# Altium footprint library PcbLib_ICs.PcbLib: 317 footprints (part 13 of 24)
Each footprint in its own frame and in the unit in brackets; x right, y up, seen from the top. Pads: shape width x height; smd on the part's side, far side on the other; paste and mask are expansions set on the pad; w line width, h text height; cw(c..) or ccw(c..) is an arc to the next point about the centre after c.
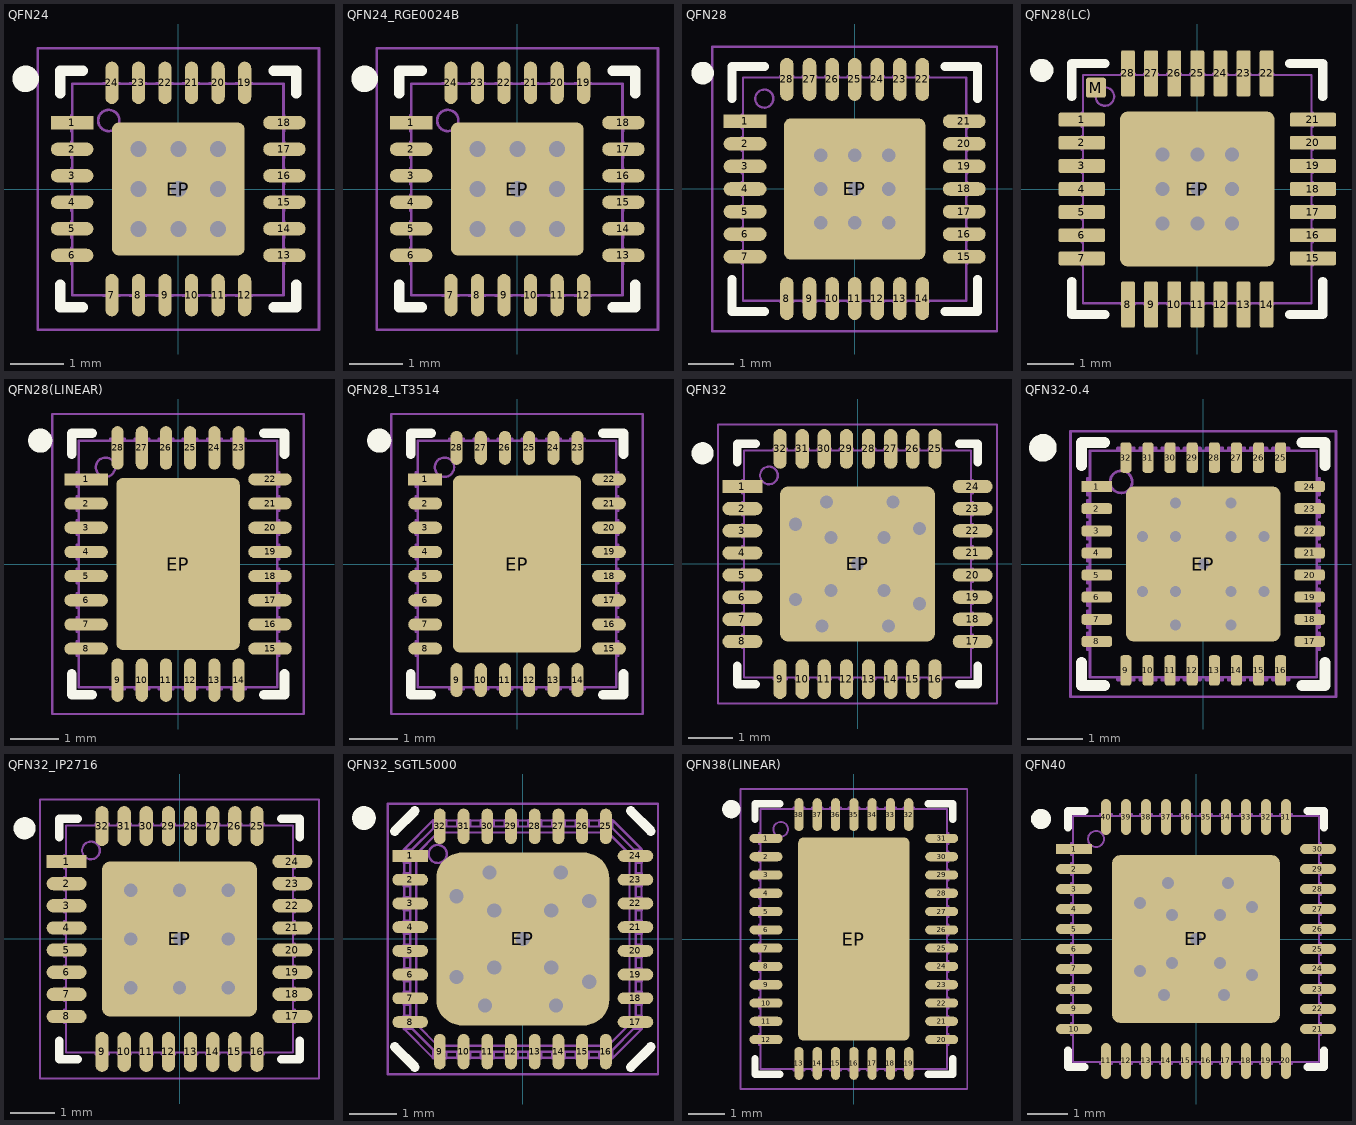
[diagram p12: the footprints below, top view; thin cyan lines are the x and y axes]

## QFN24 [mm] "QFN, 24-Leads, Body 4.00x4.00mm, Pitch 0.50mm, Thermal Pad 2.50x2.50mm, IPC Medium Density"
height 1
pads (25):
  rect 0.8x0.25 smd paste+0 mask+0.05: 1(-2,1.25)
  oval 0.8x0.25 smd paste+0 mask+0.05: 2(-2,0.75) 3(-2,0.25) 4(-2,-0.25) 5(-2,-0.75) 6(-2,-1.25) 13(2,-1.25) 14(2,-0.75) 15(2,-0.25) 16(2,0.25) 17(2,0.75) 18(2,1.25)
  oval 0.25x0.8 smd paste+0 mask+0.05: 7(-1.25,-2) 8(-0.75,-2) 9(-0.25,-2) 10(0.25,-2) 11(0.75,-2) 12(1.25,-2) 19(1.25,2) 20(0.75,2) 21(0.25,2) 22(-0.25,2) 23(-0.75,2) 24(-1.25,2)
  rrect10% 2.5x2.5 smd paste-10: EP(0,0)
via 0,-0.75 diameter 0.7 hole 0.3
via 0.75,0 diameter 0.7 hole 0.3
via 0,0.75 diameter 0.7 hole 0.3
via -0.75,0 diameter 0.7 hole 0.3
via -0.75,-0.75 diameter 0.7 hole 0.3
via 0.75,-0.75 diameter 0.7 hole 0.3
via 0.75,0.75 diameter 0.7 hole 0.3
via -0.75,0.75 diameter 0.7 hole 0.3
via 0,0 diameter 0.7 hole 0.3
Top Overlay:
  circle w0.25: c-2.875,2.075 r0.125
  lines w0.2: -2.225,-1.8 -2.225,-2.225 -1.8,-2.225 ; -2.225,1.8 -2.225,2.225 -1.8,2.225 ; 1.8,-2.225 2.225,-2.225 2.225,-1.8 ; 1.8,2.225 2.225,2.225 2.225,1.8
Top Paste:
  rectangle: -1.15,0.65 -0.65,1.15
  rectangle: -0.55,0.65 -0.05,1.15
  rectangle: 0.05,0.65 0.55,1.15
  rectangle: 0.65,0.65 1.15,1.15
  rectangle: 0.65,0.05 1.15,0.55
  rectangle: 0.05,0.05 0.55,0.55
  rectangle: -0.55,0.05 -0.05,0.55
  rectangle: -1.15,0.05 -0.65,0.55
  rectangle: 0.65,-0.55 1.15,-0.05
  rectangle: 0.05,-0.55 0.55,-0.05
  rectangle: -0.55,-0.55 -0.05,-0.05
  rectangle: -1.15,-0.55 -0.65,-0.05
  rectangle: 0.65,-1.15 1.15,-0.65
  rectangle: 0.05,-1.15 0.55,-0.65
  rectangle: -0.55,-1.15 -0.05,-0.65
  rectangle: -1.15,-1.15 -0.65,-0.65
Bottom Solder:
  region: -1.5,1.5 -0.25,1.5 0,1.25 0.25,1.5 1.5,1.499 1.5,0.25 1.25,0 1.5,-0.25 1.5,-1.5 0.25,-1.5 0,-1.25 -0.25,-1.5 -1.5,-1.5 -1.5,-0.25 -1.25,0 -1.5,0.25
Top Assy:
  circle w0.05: c-1.31,1.29 r0.2
  lines w0.05: -2,-1.415 -2.01,-1.415 -2.01,-1.105 -2,-1.105 ; -2,-0.915 -2.01,-0.915 -2.01,-0.605 -2,-0.605 ; -2,-0.415 -2.01,-0.415 -2.01,-0.105 -2,-0.105 ; -2,0.085 -2.01,0.085 -2.01,0.395 -2,0.395 ; -2,0.585 -2.01,0.585 -2.01,0.895 -2,0.895 ; -2,1.085 -2.01,1.085 -2.01,1.395 -2,1.395 ; -1.415,-2 -1.415,-2.01 -1.105,-2.01 -1.105,-2 ; -1.415,1.98 -1.415,1.99 -1.105,1.99 -1.105,1.98 ; -0.915,-2 -0.915,-2.01 -0.605,-2.01 -0.605,-2 ; -0.915,1.98 -0.915,1.99 -0.605,1.99 -0.605,1.98 ; -0.415,-2 -0.415,-2.01 -0.105,-2.01 -0.105,-2 ; -0.415,1.98 -0.415,1.99 -0.105,1.99 -0.105,1.98 ; 0.085,-2 0.085,-2.01 0.395,-2.01 0.395,-2 ; 0.085,1.98 0.085,1.99 0.395,1.99 0.395,1.98 ; 0.585,-2 0.585,-2.01 0.895,-2.01 0.895,-2 ; 0.585,1.98 0.585,1.99 0.895,1.99 0.895,1.98 ; 1.085,-2 1.085,-2.01 1.395,-2.01 1.395,-2 ; 1.085,1.98 1.085,1.99 1.395,1.99 1.395,1.98 ; 1.98,-1.415 1.99,-1.415 1.99,-1.105 1.98,-1.105 ; 1.98,-0.915 1.99,-0.915 1.99,-0.605 1.98,-0.605 ; 1.98,-0.415 1.99,-0.415 1.99,-0.105 1.98,-0.105 ; 1.98,0.085 1.99,0.085 1.99,0.395 1.98,0.395 ; 1.98,0.585 1.99,0.585 1.99,0.895 1.98,0.895 ; 1.98,1.085 1.99,1.085 1.99,1.395 1.98,1.395 ; -2,-2 -2,1.98 1.98,1.98 1.98,-2 -2,-2
  text ".Designator" at -3.443,-0.467 h2
Top Text:
  lines w0.05: -2.65,-2.65 -2.65,2.65 2.65,2.65 2.65,-2.65 -2.65,-2.65
  lines w0.1: -0.5,0 0.5,0 ; 0,-0.5 0,0.5
3D body "User Library-QFN24-0_5.STEP": height 1, standoff 0, extent -2,-2 2,2

## QFN24_RGE0024B [mm] "QFN, 24-Leads, Body 4.00x4.00mm, Pitch 0.50mm, Thermal Pad 2.50x2.50mm, IPC Medium Density"
height 1
pads (25):
  rect 0.8x0.25 smd paste+0 mask+0.05: 1(-2,1.25)
  oval 0.8x0.25 smd paste+0 mask+0.05: 2(-2,0.75) 3(-2,0.25) 4(-2,-0.25) 5(-2,-0.75) 6(-2,-1.25) 13(2,-1.25) 14(2,-0.75) 15(2,-0.25) 16(2,0.25) 17(2,0.75) 18(2,1.25)
  oval 0.25x0.8 smd paste+0 mask+0.05: 7(-1.25,-2) 8(-0.75,-2) 9(-0.25,-2) 10(0.25,-2) 11(0.75,-2) 12(1.25,-2) 19(1.25,2) 20(0.75,2) 21(0.25,2) 22(-0.25,2) 23(-0.75,2) 24(-1.25,2)
  rrect10% 2.5x2.5 smd paste-10: EP(0,0)
via 0,0 diameter 0.7 hole 0.3
via -0.75,0.75 diameter 0.7 hole 0.3
via 0.75,0.75 diameter 0.7 hole 0.3
via 0.75,-0.75 diameter 0.7 hole 0.3
via -0.75,-0.75 diameter 0.7 hole 0.3
via -0.75,0 diameter 0.7 hole 0.3
via 0,0.75 diameter 0.7 hole 0.3
via 0.75,0 diameter 0.7 hole 0.3
via 0,-0.75 diameter 0.7 hole 0.3
Top Overlay:
  circle w0.25: c-2.875,2.075 r0.125
  lines w0.2: -2.225,-1.8 -2.225,-2.225 -1.8,-2.225 ; -2.225,1.8 -2.225,2.225 -1.8,2.225 ; 1.8,-2.225 2.225,-2.225 2.225,-1.8 ; 1.8,2.225 2.225,2.225 2.225,1.8
Top Paste:
  rectangle: -1.15,-1.15 -0.65,-0.65
  rectangle: -0.55,-1.15 -0.05,-0.65
  rectangle: 0.05,-1.15 0.55,-0.65
  rectangle: 0.65,-1.15 1.15,-0.65
  rectangle: -1.15,-0.55 -0.65,-0.05
  rectangle: -0.55,-0.55 -0.05,-0.05
  rectangle: 0.05,-0.55 0.55,-0.05
  rectangle: 0.65,-0.55 1.15,-0.05
  rectangle: -1.15,0.05 -0.65,0.55
  rectangle: -0.55,0.05 -0.05,0.55
  rectangle: 0.05,0.05 0.55,0.55
  rectangle: 0.65,0.05 1.15,0.55
  rectangle: 0.65,0.65 1.15,1.15
  rectangle: 0.05,0.65 0.55,1.15
  rectangle: -0.55,0.65 -0.05,1.15
  rectangle: -1.15,0.65 -0.65,1.15
Bottom Solder:
  region: -1.5,1.5 -0.25,1.5 0,1.25 0.25,1.5 1.5,1.499 1.5,0.25 1.25,0 1.5,-0.25 1.5,-1.5 0.25,-1.5 0,-1.25 -0.25,-1.5 -1.5,-1.5 -1.5,-0.25 -1.25,0 -1.5,0.25
Top Assy:
  circle w0.05: c-1.31,1.29 r0.2
  lines w0.05: -2,-1.415 -2.01,-1.415 -2.01,-1.105 -2,-1.105 ; -2,-0.915 -2.01,-0.915 -2.01,-0.605 -2,-0.605 ; -2,-0.415 -2.01,-0.415 -2.01,-0.105 -2,-0.105 ; -2,0.085 -2.01,0.085 -2.01,0.395 -2,0.395 ; -2,0.585 -2.01,0.585 -2.01,0.895 -2,0.895 ; -2,1.085 -2.01,1.085 -2.01,1.395 -2,1.395 ; -1.415,-2 -1.415,-2.01 -1.105,-2.01 -1.105,-2 ; -1.415,1.98 -1.415,1.99 -1.105,1.99 -1.105,1.98 ; -0.915,-2 -0.915,-2.01 -0.605,-2.01 -0.605,-2 ; -0.915,1.98 -0.915,1.99 -0.605,1.99 -0.605,1.98 ; -0.415,-2 -0.415,-2.01 -0.105,-2.01 -0.105,-2 ; -0.415,1.98 -0.415,1.99 -0.105,1.99 -0.105,1.98 ; 0.085,-2 0.085,-2.01 0.395,-2.01 0.395,-2 ; 0.085,1.98 0.085,1.99 0.395,1.99 0.395,1.98 ; 0.585,-2 0.585,-2.01 0.895,-2.01 0.895,-2 ; 0.585,1.98 0.585,1.99 0.895,1.99 0.895,1.98 ; 1.085,-2 1.085,-2.01 1.395,-2.01 1.395,-2 ; 1.085,1.98 1.085,1.99 1.395,1.99 1.395,1.98 ; 1.98,-1.415 1.99,-1.415 1.99,-1.105 1.98,-1.105 ; 1.98,-0.915 1.99,-0.915 1.99,-0.605 1.98,-0.605 ; 1.98,-0.415 1.99,-0.415 1.99,-0.105 1.98,-0.105 ; 1.98,0.085 1.99,0.085 1.99,0.395 1.98,0.395 ; 1.98,0.585 1.99,0.585 1.99,0.895 1.98,0.895 ; 1.98,1.085 1.99,1.085 1.99,1.395 1.98,1.395 ; -2,-2 1.98,-2 1.98,1.98 -2,1.98 -2,-2
  text ".Designator" at -3.443,-0.467 h2
Top Text:
  lines w0.05: -2.65,-2.65 2.65,-2.65 2.65,2.65 -2.65,2.65 -2.65,-2.65
  lines w0.1: -0.5,0 0.5,0 ; 0,-0.5 0,0.5
3D body "RGE0024B.STEP": height 1, standoff 0, extent -2.025,-2.025 2.025,2.025

## QFN28 [mm] "QFN, 28-Leads, Body 5.00x5.00mm, Pitch 0.50mm, Thermal Pad 3.13x3.13mm, IPC Medium Density"
height 1
pads (29):
  rect 0.95x0.3 smd paste+0 mask+0.05: 1(-2.425,1.5)
  oval 0.95x0.3 smd paste+0 mask+0.05: 2(-2.425,1) 3(-2.425,0.5) 4(-2.425,0) 5(-2.425,-0.5) 6(-2.425,-1) 7(-2.425,-1.5) 15(2.425,-1.5) 16(2.425,-1) 17(2.425,-0.5) 18(2.425,0) 19(2.425,0.5) 20(2.425,1) 21(2.425,1.5)
  oval 0.3x0.95 smd paste+0 mask+0.05: 8(-1.5,-2.425) 9(-1,-2.425) 10(-0.5,-2.425) 11(0,-2.425) 12(0.5,-2.425) 13(1,-2.425) 14(1.5,-2.425) 22(1.5,2.425) 23(1,2.425) 24(0.5,2.425) 25(0,2.425) 26(-0.5,2.425) 27(-1,2.425) 28(-1.5,2.425)
  rrect10% 3.13x3.13 smd paste-10: EP(0,0)
via 0,0 diameter 0.7 hole 0.3
via -0.75,0.75 diameter 0.7 hole 0.3
via 0.75,0.75 diameter 0.7 hole 0.3
via 0.75,-0.75 diameter 0.7 hole 0.3
via -0.75,-0.75 diameter 0.7 hole 0.3
via -0.75,0 diameter 0.7 hole 0.3
via 0,0.75 diameter 0.7 hole 0.3
via 0.75,0 diameter 0.7 hole 0.3
via 0,-0.75 diameter 0.7 hole 0.3
Top Overlay:
  circle w0.25: c-3.365,2.565 r0.125
  lines w0.2: -2.715,-2 -2.715,-2.715 -2,-2.715 ; -2.715,2 -2.715,2.715 -2,2.715 ; 2,-2.715 2.715,-2.715 2.715,-2 ; 2,2.715 2.715,2.715 2.715,2
Top Paste:
  rectangle: -1.5,0.6 -0.6,1.5
  rectangle: -0.45,0.6 0.45,1.5
  rectangle: 0.6,0.6 1.5,1.5
  rectangle: -1.5,-0.45 -0.6,0.45
  rectangle: -1.5,-1.5 -0.6,-0.6
  rectangle: -0.45,-0.45 0.45,0.45
  rectangle: 0.6,-0.45 1.5,0.45
  rectangle: -0.45,-1.5 0.45,-0.6
  rectangle: 0.6,-1.5 1.5,-0.6
Bottom Solder:
  region: -1.75,1.75 -0.5,1.75 0,1.25 0.5,1.75 1.75,1.749 1.75,0.5 1.25,0 1.75,-0.5 1.75,-1.75 0.5,-1.75 0,-1.25 -0.5,-1.75 -1.75,-1.75 -1.75,-0.5 -1.25,0 -1.75,0.5
Top Assy:
  circle w0.05: c-2,2 r0.2
  lines w0.05: -2.473,-1.653 -2.505,-1.653 -2.505,-1.353 -2.473,-1.353 ; -2.473,-1.153 -2.505,-1.153 -2.505,-0.853 -2.473,-0.853 ; -2.473,-0.653 -2.505,-0.653 -2.505,-0.353 -2.473,-0.353 ; -2.473,-0.153 -2.505,-0.153 -2.505,0.147 -2.473,0.147 ; -2.473,0.347 -2.505,0.347 -2.505,0.647 -2.473,0.647 ; -2.473,0.847 -2.505,0.847 -2.505,1.147 -2.473,1.147 ; -2.473,1.347 -2.505,1.347 -2.505,1.647 -2.473,1.647 ; -1.653,-2.472 -1.653,-2.5 -1.353,-2.5 -1.353,-2.472 ; -1.653,2.467 -1.653,2.5 -1.353,2.5 -1.353,2.467 ; -1.153,-2.472 -1.153,-2.5 -0.853,-2.5 -0.853,-2.472 ; -1.153,2.467 -1.153,2.5 -0.853,2.5 -0.853,2.467 ; -0.653,-2.472 -0.653,-2.5 -0.353,-2.5 -0.353,-2.472 ; -0.653,2.467 -0.653,2.5 -0.353,2.5 -0.353,2.467 ; -0.153,-2.472 -0.153,-2.5 0.147,-2.5 0.147,-2.472 ; -0.153,2.467 -0.153,2.5 0.147,2.5 0.147,2.467 ; 0.347,-2.472 0.347,-2.5 0.647,-2.5 0.647,-2.472 ; 0.347,2.467 0.347,2.5 0.647,2.5 0.647,2.467 ; 0.847,-2.472 0.847,-2.5 1.147,-2.5 1.147,-2.472 ; 0.847,2.467 0.847,2.5 1.147,2.5 1.147,2.467 ; 1.347,-2.472 1.347,-2.5 1.647,-2.5 1.647,-2.472 ; 1.347,2.467 1.347,2.5 1.647,2.5 1.647,2.467 ; 2.471,-1.653 2.495,-1.653 2.495,-1.353 2.471,-1.353 ; 2.471,-1.153 2.495,-1.153 2.495,-0.853 2.471,-0.853 ; 2.471,-0.653 2.495,-0.653 2.495,-0.353 2.471,-0.353 ; 2.471,-0.153 2.495,-0.153 2.495,0.147 2.471,0.147 ; 2.471,0.347 2.495,0.347 2.495,0.647 2.471,0.647 ; 2.471,0.847 2.495,0.847 2.495,1.147 2.471,1.147 ; 2.471,1.347 2.495,1.347 2.495,1.647 2.471,1.647 ; -2.473,-2.472 2.471,-2.472 2.471,2.467 -2.473,2.467 -2.473,-2.472
  text ".Designator" at -3.443,-0.467 h2
Top Text:
  lines w0.05: -3.15,-3.15 -3.15,3.15 3.15,3.15 3.15,-3.15 -3.15,-3.15
  lines w0.1: -0.5,0 0.5,0 ; 0,-0.5 0,0.5
3D body "QFN28.STEP": height 1.08, standoff 0.01, extent -2.5,-2.5 2.5,2.5

## QFN28(LC) [mm] "QFN-28"
pads (30):
  rrect25% 1x0.3 smd paste+0 mask+0.05: 1(-2.5,1.5) 2(-2.5,1) 3(-2.5,0.5) 4(-2.5,0) 5(-2.5,-0.5) 6(-2.5,-1) 7(-2.5,-1.5) 15(2.5,-1.5) 16(2.5,-1) 17(2.5,-0.5) 18(2.5,0) 19(2.5,0.5) 20(2.5,1) 21(2.5,1.5)
  rrect25% 0.3x1 smd paste+0 mask+0.05: 8(-1.5,-2.5) 9(-1,-2.5) 10(-0.5,-2.5) 11(0,-2.5) 12(0.5,-2.5) 13(1,-2.5) 14(1.5,-2.5) 22(1.5,2.5) 23(1,2.5) 24(0.5,2.5) 25(0,2.5) 26(-0.5,2.5) 27(-1,2.5) 28(-1.5,2.5)
  rrect10% 3.35x3.35 smd paste-50 mask+0.05: EP(0,0)
  rrect25% 0.435x0.435 smd paste+0 mask+0.05: M(-2.193,2.193)
via 0,-0.75 diameter 0.7 hole 0.3
via 0.75,0 diameter 0.7 hole 0.3
via 0,0.75 diameter 0.7 hole 0.3
via -0.75,0 diameter 0.7 hole 0.3
via -0.75,-0.75 diameter 0.7 hole 0.3
via 0.75,-0.75 diameter 0.7 hole 0.3
via 0.75,0.75 diameter 0.7 hole 0.3
via -0.75,0.75 diameter 0.7 hole 0.3
via 0,0 diameter 0.7 hole 0.3
Top Overlay:
  circle w0.25: c-3.365,2.565 r0.125
  lines w0.2: -2.715,-2 -2.715,-2.715 -2,-2.715 ; -2.715,2 -2.715,2.715 -2,2.715 ; 2,-2.715 2.715,-2.715 2.715,-2 ; 2,2.715 2.715,2.715 2.715,2
Top Paste:
  region: 0.25,0.25 -0.25,0.25 -0.25,-0.25 0.25,-0.25
  region: 0.95,0.25 0.45,0.25 0.45,-0.25 0.95,-0.25
  rectangle: -0.95,-0.25 -0.45,0.25
  region: 1.65,0.25 1.15,0.25 1.15,-0.25 1.65,-0.25
  rectangle: -1.65,-0.25 -1.15,0.25
  region: 0.25,0.95 -0.25,0.95 -0.25,0.45 0.25,0.45
  region: 0.95,0.95 0.45,0.95 0.45,0.45 0.95,0.45
  rectangle: -0.95,0.45 -0.45,0.95
  region: 1.65,0.95 1.15,0.95 1.15,0.45 1.65,0.45
  rectangle: -1.65,0.45 -1.15,0.95
  rectangle: -0.25,1.15 0.25,1.65
  rectangle: -0.95,1.15 -0.45,1.65
  region: 0.95,1.65 0.45,1.65 0.45,1.15 0.95,1.15
  rectangle: -1.65,1.15 -1.15,1.65
  region: 1.65,1.65 1.15,1.65 1.15,1.15 1.65,1.15
  region: 0.25,-0.45 -0.25,-0.45 -0.25,-0.95 0.25,-0.95
  region: 0.95,-0.45 0.45,-0.45 0.45,-0.95 0.95,-0.95
  rectangle: -0.95,-0.95 -0.45,-0.45
  region: 1.65,-0.45 1.15,-0.45 1.15,-0.95 1.65,-0.95
  rectangle: -1.65,-0.95 -1.15,-0.45
  region: 0.25,-1.15 -0.25,-1.15 -0.25,-1.65 0.25,-1.65
  region: 0.95,-1.15 0.45,-1.15 0.45,-1.65 0.95,-1.65
  rectangle: -0.95,-1.65 -0.45,-1.15
  region: 1.65,-1.15 1.15,-1.15 1.15,-1.65 1.65,-1.65
  rectangle: -1.65,-1.65 -1.15,-1.15
Bottom Solder:
  region: -1.75,1.75 -0.5,1.75 0,1.25 0.5,1.75 1.75,1.749 1.75,0.5 1.25,0 1.75,-0.5 1.75,-1.75 0.5,-1.75 0,-1.25 -0.5,-1.75 -1.75,-1.75 -1.75,-0.5 -1.25,0 -1.75,0.5
Top Assy:
  circle w0.05: c-2,2 r0.2
  lines w0.05: -2.473,-1.653 -2.505,-1.653 -2.505,-1.353 -2.473,-1.353 ; -2.473,-1.153 -2.505,-1.153 -2.505,-0.853 -2.473,-0.853 ; -2.473,-0.653 -2.505,-0.653 -2.505,-0.353 -2.473,-0.353 ; -2.473,-0.153 -2.505,-0.153 -2.505,0.147 -2.473,0.147 ; -2.473,0.347 -2.505,0.347 -2.505,0.647 -2.473,0.647 ; -2.473,0.847 -2.505,0.847 -2.505,1.147 -2.473,1.147 ; -2.473,1.347 -2.505,1.347 -2.505,1.647 -2.473,1.647 ; -1.653,-2.472 -1.653,-2.5 -1.353,-2.5 -1.353,-2.472 ; -1.653,2.467 -1.653,2.5 -1.353,2.5 -1.353,2.467 ; -1.153,-2.472 -1.153,-2.5 -0.853,-2.5 -0.853,-2.472 ; -1.153,2.467 -1.153,2.5 -0.853,2.5 -0.853,2.467 ; -0.653,-2.472 -0.653,-2.5 -0.353,-2.5 -0.353,-2.472 ; -0.653,2.467 -0.653,2.5 -0.353,2.5 -0.353,2.467 ; -0.153,-2.472 -0.153,-2.5 0.147,-2.5 0.147,-2.472 ; -0.153,2.467 -0.153,2.5 0.147,2.5 0.147,2.467 ; 0.347,-2.472 0.347,-2.5 0.647,-2.5 0.647,-2.472 ; 0.347,2.467 0.347,2.5 0.647,2.5 0.647,2.467 ; 0.847,-2.472 0.847,-2.5 1.147,-2.5 1.147,-2.472 ; 0.847,2.467 0.847,2.5 1.147,2.5 1.147,2.467 ; 1.347,-2.472 1.347,-2.5 1.647,-2.5 1.647,-2.472 ; 1.347,2.467 1.347,2.5 1.647,2.5 1.647,2.467 ; 2.471,-1.653 2.495,-1.653 2.495,-1.353 2.471,-1.353 ; 2.471,-1.153 2.495,-1.153 2.495,-0.853 2.471,-0.853 ; 2.471,-0.653 2.495,-0.653 2.495,-0.353 2.471,-0.353 ; 2.471,-0.153 2.495,-0.153 2.495,0.147 2.471,0.147 ; 2.471,0.347 2.495,0.347 2.495,0.647 2.471,0.647 ; 2.471,0.847 2.495,0.847 2.495,1.147 2.471,1.147 ; 2.471,1.347 2.495,1.347 2.495,1.647 2.471,1.647 ; -2.473,-2.472 2.471,-2.472 2.471,2.467 -2.473,2.467 -2.473,-2.472
  text ".Designator" at -3.443,-0.467 h2
Top Text:
  lines w0.1: -0.5,0 0.5,0 ; 0,-0.5 0,0.5
3D body "QFN28.STEP": height 1.08, standoff 0.01, extent -2.5,-2.5 2.5,2.5

## QFN28(LINEAR) [mm] "QFN-28 package 4x5 mm from Linear Technology devices"
height 0.75
pads (29):
  rect 0.9x0.25 smd paste+0 mask+0.05: 1(-1.9,1.75)
  oval 0.9x0.25 smd paste+0 mask+0.05: 2(-1.9,1.25) 3(-1.9,0.75) 4(-1.9,0.25) 5(-1.9,-0.25) 6(-1.9,-0.75) 7(-1.9,-1.25) 8(-1.9,-1.75) 15(1.9,-1.75) 16(1.9,-1.25) 17(1.9,-0.75) 18(1.9,-0.25) 19(1.9,0.25) 20(1.9,0.75) 21(1.9,1.25) 22(1.9,1.75)
  oval 0.25x0.9 smd paste+0 mask+0.05: 9(-1.25,-2.4) 10(-0.75,-2.4) 11(-0.25,-2.4) 12(0.25,-2.4) 13(0.75,-2.4) 14(1.25,-2.4) 23(1.25,2.4) 24(0.75,2.4) 25(0.25,2.4) 26(-0.25,2.4) 27(-0.75,2.4) 28(-1.25,2.4)
  rrect10% 2.55x3.55 smd paste-50 mask+0.05: EP(0,0)
Top Overlay:
  circle w0.25: c-2.85,2.55 r0.125
  lines w0.2: -2.2,-2.275 -2.2,-2.7 -1.775,-2.7 ; -2.2,2.275 -2.2,2.7 -1.775,2.7 ; 1.775,-2.7 2.2,-2.7 2.2,-2.275 ; 1.775,2.7 2.2,2.7 2.2,2.275
Top Paste:
  region: 1.3,-1.15 0.8,-1.15 0.8,-1.65 1.3,-1.65
  rectangle: -1.3,-1.65 -0.8,-1.15
  region: 0.6,-1.15 0.1,-1.15 0.1,-1.65 0.6,-1.65
  region: -0.1,-1.15 -0.6,-1.15 -0.6,-1.65 -0.1,-1.65
  region: 1.3,-0.45 0.8,-0.45 0.8,-0.95 1.3,-0.95
  rectangle: -1.3,-0.95 -0.8,-0.45
  region: 0.6,-0.45 0.1,-0.45 0.1,-0.95 0.6,-0.95
  region: -0.1,-0.45 -0.6,-0.45 -0.6,-0.95 -0.1,-0.95
  rectangle: -1.3,1.15 -0.8,1.65
  region: 1.3,1.65 0.8,1.65 0.8,1.15 1.3,1.15
  rectangle: -0.6,1.15 -0.1,1.65
  rectangle: 0.1,1.15 0.6,1.65
  rectangle: -1.3,0.45 -0.8,0.95
  region: 1.3,0.95 0.8,0.95 0.8,0.45 1.3,0.45
  rectangle: -0.6,0.45 -0.1,0.95
  rectangle: 0.1,0.45 0.6,0.95
  region: 1.3,0.25 0.8,0.25 0.8,-0.25 1.3,-0.25
  rectangle: -1.3,-0.25 -0.8,0.25
  region: 0.6,0.25 0.1,0.25 0.1,-0.25 0.6,-0.25
  region: -0.1,0.25 -0.6,0.25 -0.6,-0.25 -0.1,-0.25
Top Assy:
  circle w0.05: c-1.5,2 r0.2
  lines w0.05: -2.057,-1.9 -2.09,-1.9 -2.09,-1.6 -2.057,-1.6 ; -2.057,-1.4 -2.09,-1.4 -2.09,-1.1 -2.057,-1.1 ; -2.057,-0.9 -2.09,-0.9 -2.09,-0.6 -2.057,-0.6 ; -2.057,-0.4 -2.09,-0.4 -2.09,-0.1 -2.057,-0.1 ; -2.057,0.1 -2.09,0.1 -2.09,0.4 -2.057,0.4 ; -2.057,0.6 -2.09,0.6 -2.09,0.9 -2.057,0.9 ; -2.057,1.1 -2.09,1.1 -2.09,1.4 -2.057,1.4 ; -2.057,1.6 -2.09,1.6 -2.09,1.9 -2.057,1.9 ; -1.4,-2.557 -1.4,-2.59 -1.1,-2.59 -1.1,-2.557 ; -1.4,2.557 -1.4,2.59 -1.1,2.59 -1.1,2.557 ; -0.9,-2.557 -0.9,-2.59 -0.6,-2.59 -0.6,-2.557 ; -0.9,2.557 -0.9,2.59 -0.6,2.59 -0.6,2.557 ; -0.4,-2.557 -0.4,-2.59 -0.1,-2.59 -0.1,-2.557 ; -0.4,2.557 -0.4,2.59 -0.1,2.59 -0.1,2.557 ; 0.1,-2.557 0.1,-2.59 0.4,-2.59 0.4,-2.557 ; 0.1,2.557 0.1,2.59 0.4,2.59 0.4,2.557 ; 0.6,-2.557 0.6,-2.59 0.9,-2.59 0.9,-2.557 ; 0.6,2.557 0.6,2.59 0.9,2.59 0.9,2.557 ; 1.1,-2.557 1.1,-2.59 1.4,-2.59 1.4,-2.557 ; 1.1,2.557 1.1,2.59 1.4,2.59 1.4,2.557 ; 2.057,-1.9 2.09,-1.9 2.09,-1.6 2.057,-1.6 ; 2.057,-1.4 2.09,-1.4 2.09,-1.1 2.057,-1.1 ; 2.057,-0.9 2.09,-0.9 2.09,-0.6 2.057,-0.6 ; 2.057,-0.4 2.09,-0.4 2.09,-0.1 2.057,-0.1 ; 2.057,0.1 2.09,0.1 2.09,0.4 2.057,0.4 ; 2.057,0.6 2.09,0.6 2.09,0.9 2.057,0.9 ; 2.057,1.1 2.09,1.1 2.09,1.4 2.057,1.4 ; 2.057,1.6 2.09,1.6 2.09,1.9 2.057,1.9 ; -2.05,-2.55 2.05,-2.55 2.05,2.55 -2.05,2.55 -2.05,-2.55
  text ".Designator" at -3.443,-0.467 h2
Top Text:
  lines w0.05: -2.6,-3.1 2.6,-3.1 2.6,3.1 -2.6,3.1 -2.6,-3.1
  lines w0.1: -0.5,0 0.5,0 ; 0,-0.5 0,0.5
3D body "QFN-28(LINEAR).step": height 0.75, standoff 0, extent -2.1,-2.6 2.1,2.6

## QFN28_LT3514 [mm] "QFN-28 package 4x5 mm from Linear Technology devices"
height 0.75
pads (29):
  rect 0.7x0.25 smd paste+0 mask+0.05: 1(-1.9,1.75)
  oval 0.7x0.25 smd paste+0 mask+0.05: 2(-1.9,1.25) 3(-1.9,0.75) 4(-1.9,0.25) 5(-1.9,-0.25) 6(-1.9,-0.75) 7(-1.9,-1.25) 8(-1.9,-1.75) 15(1.9,-1.75) 16(1.9,-1.25) 17(1.9,-0.75) 18(1.9,-0.25) 19(1.9,0.25) 20(1.9,0.75) 21(1.9,1.25) 22(1.9,1.75)
  oval 0.25x0.7 smd paste+0 mask+0.05: 9(-1.25,-2.4) 10(-0.75,-2.4) 11(-0.25,-2.4) 12(0.25,-2.4) 13(0.75,-2.4) 14(1.25,-2.4) 23(1.25,2.4) 24(0.75,2.4) 25(0.25,2.4) 26(-0.25,2.4) 27(-0.75,2.4) 28(-1.25,2.4)
  rrect10% 2.65x3.65 smd paste-50 mask+0.05: EP(0,0)
Top Overlay:
  circle w0.25: c-2.85,2.55 r0.125
  lines w0.2: -2.2,-2.275 -2.2,-2.7 -1.775,-2.7 ; -2.2,2.275 -2.2,2.7 -1.775,2.7 ; 1.775,-2.7 2.2,-2.7 2.2,-2.275 ; 1.775,2.7 2.2,2.7 2.2,2.275
Top Paste:
  region: 1.3,-1.15 0.8,-1.15 0.8,-1.65 1.3,-1.65
  rectangle: -1.3,-1.65 -0.8,-1.15
  region: 0.6,-1.15 0.1,-1.15 0.1,-1.65 0.6,-1.65
  region: -0.1,-1.15 -0.6,-1.15 -0.6,-1.65 -0.1,-1.65
  region: 1.3,-0.45 0.8,-0.45 0.8,-0.95 1.3,-0.95
  rectangle: -1.3,-0.95 -0.8,-0.45
  region: 0.6,-0.45 0.1,-0.45 0.1,-0.95 0.6,-0.95
  region: -0.1,-0.45 -0.6,-0.45 -0.6,-0.95 -0.1,-0.95
  rectangle: -1.3,1.15 -0.8,1.65
  region: 1.3,1.65 0.8,1.65 0.8,1.15 1.3,1.15
  rectangle: -0.6,1.15 -0.1,1.65
  rectangle: 0.1,1.15 0.6,1.65
  rectangle: -1.3,0.45 -0.8,0.95
  region: 1.3,0.95 0.8,0.95 0.8,0.45 1.3,0.45
  rectangle: -0.6,0.45 -0.1,0.95
  rectangle: 0.1,0.45 0.6,0.95
  region: 1.3,0.25 0.8,0.25 0.8,-0.25 1.3,-0.25
  rectangle: -1.3,-0.25 -0.8,0.25
  region: 0.6,0.25 0.1,0.25 0.1,-0.25 0.6,-0.25
  region: -0.1,0.25 -0.6,0.25 -0.6,-0.25 -0.1,-0.25
Top Assy:
  circle w0.05: c-1.5,2 r0.2
  lines w0.05: -2.057,-1.9 -2.09,-1.9 -2.09,-1.6 -2.057,-1.6 ; -2.057,-1.4 -2.09,-1.4 -2.09,-1.1 -2.057,-1.1 ; -2.057,-0.9 -2.09,-0.9 -2.09,-0.6 -2.057,-0.6 ; -2.057,-0.4 -2.09,-0.4 -2.09,-0.1 -2.057,-0.1 ; -2.057,0.1 -2.09,0.1 -2.09,0.4 -2.057,0.4 ; -2.057,0.6 -2.09,0.6 -2.09,0.9 -2.057,0.9 ; -2.057,1.1 -2.09,1.1 -2.09,1.4 -2.057,1.4 ; -2.057,1.6 -2.09,1.6 -2.09,1.9 -2.057,1.9 ; -1.4,-2.557 -1.4,-2.59 -1.1,-2.59 -1.1,-2.557 ; -1.4,2.557 -1.4,2.59 -1.1,2.59 -1.1,2.557 ; -0.9,-2.557 -0.9,-2.59 -0.6,-2.59 -0.6,-2.557 ; -0.9,2.557 -0.9,2.59 -0.6,2.59 -0.6,2.557 ; -0.4,-2.557 -0.4,-2.59 -0.1,-2.59 -0.1,-2.557 ; -0.4,2.557 -0.4,2.59 -0.1,2.59 -0.1,2.557 ; 0.1,-2.557 0.1,-2.59 0.4,-2.59 0.4,-2.557 ; 0.1,2.557 0.1,2.59 0.4,2.59 0.4,2.557 ; 0.6,-2.557 0.6,-2.59 0.9,-2.59 0.9,-2.557 ; 0.6,2.557 0.6,2.59 0.9,2.59 0.9,2.557 ; 1.1,-2.557 1.1,-2.59 1.4,-2.59 1.4,-2.557 ; 1.1,2.557 1.1,2.59 1.4,2.59 1.4,2.557 ; 2.057,-1.9 2.09,-1.9 2.09,-1.6 2.057,-1.6 ; 2.057,-1.4 2.09,-1.4 2.09,-1.1 2.057,-1.1 ; 2.057,-0.9 2.09,-0.9 2.09,-0.6 2.057,-0.6 ; 2.057,-0.4 2.09,-0.4 2.09,-0.1 2.057,-0.1 ; 2.057,0.1 2.09,0.1 2.09,0.4 2.057,0.4 ; 2.057,0.6 2.09,0.6 2.09,0.9 2.057,0.9 ; 2.057,1.1 2.09,1.1 2.09,1.4 2.057,1.4 ; 2.057,1.6 2.09,1.6 2.09,1.9 2.057,1.9 ; -2.05,-2.55 2.05,-2.55 2.05,2.55 -2.05,2.55 -2.05,-2.55
  text ".Designator" at -3.443,-0.467 h2
Top Text:
  lines w0.05: -2.6,-3.1 2.6,-3.1 2.6,3.1 -2.6,3.1 -2.6,-3.1
  lines w0.1: -0.5,0 0.5,0 ; 0,-0.5 0,0.5
3D body "QFN-28(LT3514).STEP": height 0.75, standoff 0, extent -2.025,-2.525 2.025,2.525
